# Altium footprint library prtotype1.PcbLib: 29 footprints (part 2 of 2)
Each footprint in its own frame and in the unit in brackets; x right, y up, seen from the top. Pads: shape width x height; smd on the part's side, far side on the other; paste and mask are expansions set on the pad; w line width, h text height; cw(c..) or ccw(c..) is an arc to the next point about the centre after c.
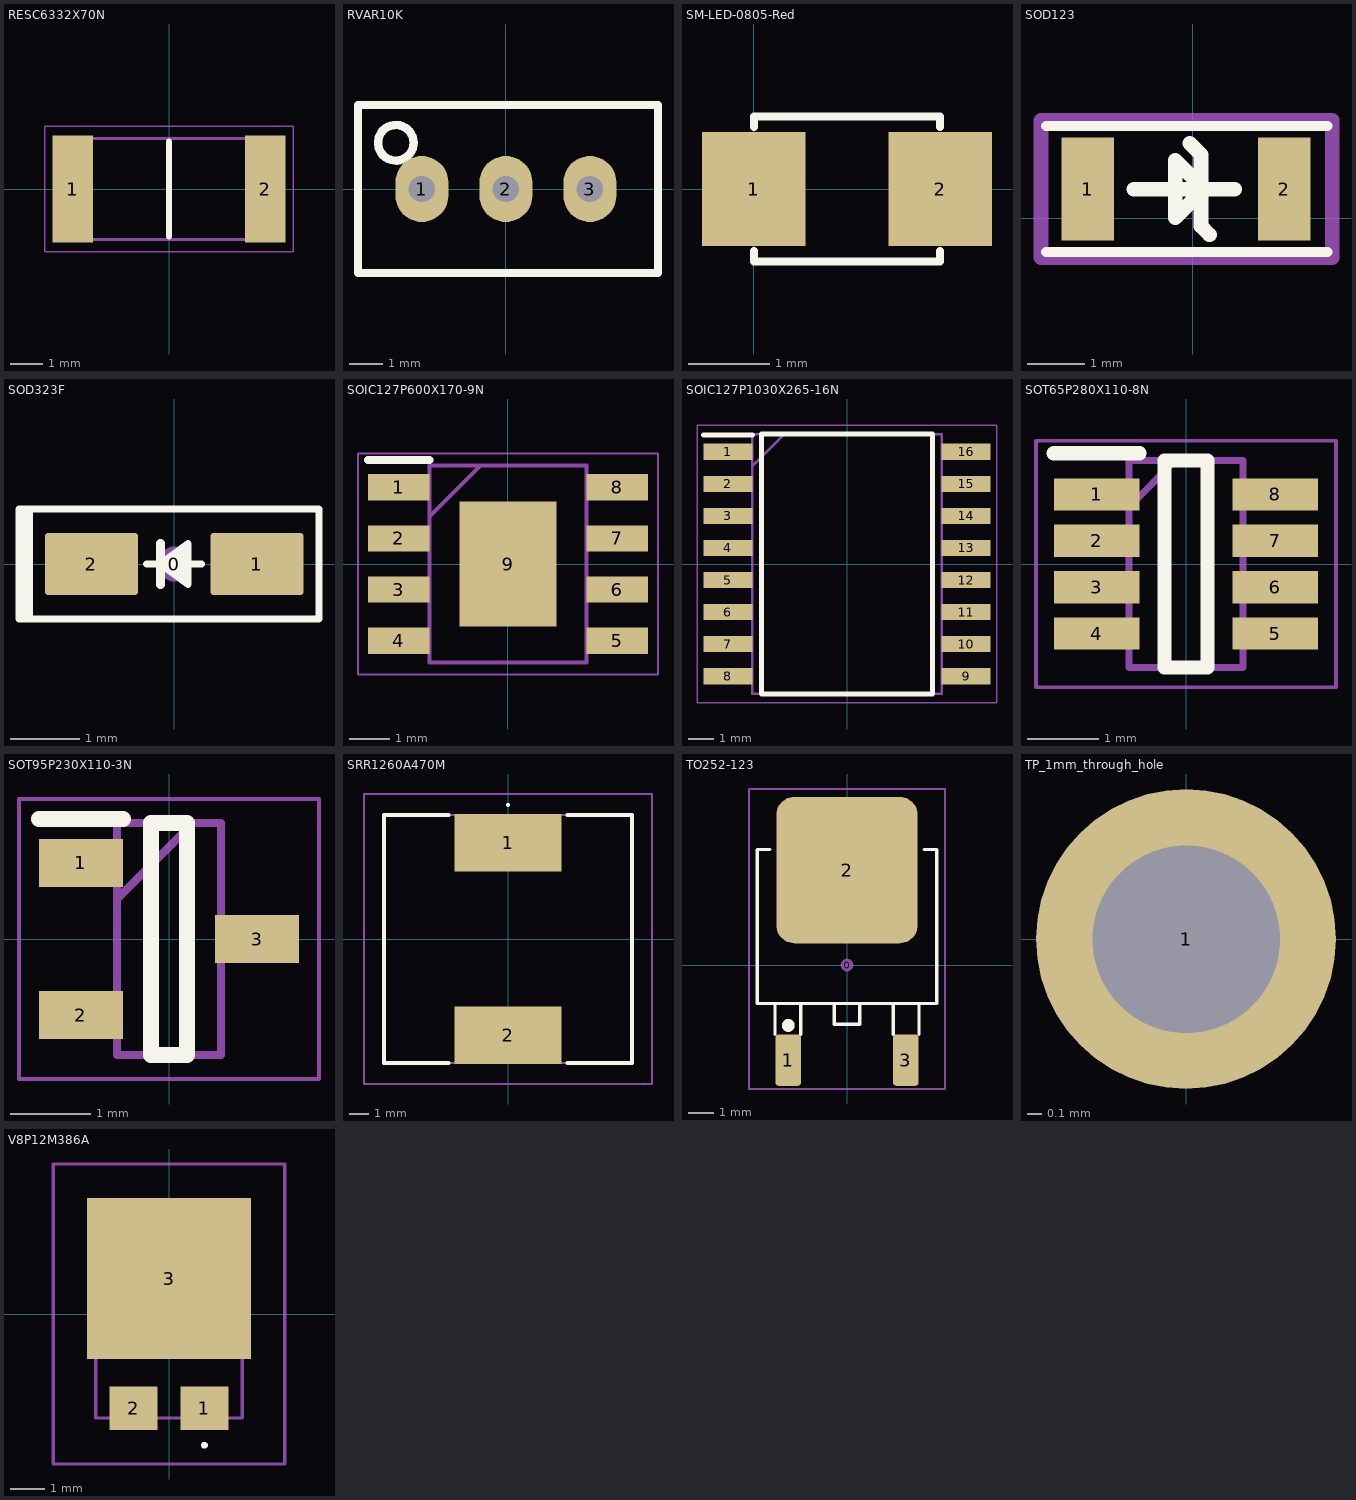
[diagram p1: the footprints below, top view; thin cyan lines are the x and y axes]

## RESC6332X70N [mm]
pads (2):
  rect 1.25x3.35 smd: 1(-3,0) 2(3,0)
Top Overlay:
  lines w0.2: 0,-1.475 0,1.475
Mechanical 13:
  lines w0.1: -3.15,-1.575 -3.15,1.575 3.15,1.575 3.15,-1.575 -3.15,-1.575
Mechanical 15:
  lines w0.05: -3.875,-1.95 -3.875,1.95 3.875,1.95 3.875,-1.95 -3.875,-1.95
3D body "CRCW251215R0JNEG.stp": height 0.7, standoff 0, extent -3.15,-1.575 3.15,1.575

## RVAR10K [mm]
pads (3):
  oval 1.6x2 hole 0.8: 1(-2.54,0) 2(0,0) 3(2.54,0)
Top Overlay:
  circle w0.254: c-3.327,1.397 r0.539
  lines w0.254: -4.47,-2.54 -4.47,2.54 4.597,2.54 4.597,-2.54 -4.47,-2.54
3D body "User Library-Potenciometro Vertical.step": height 12.02, standoff -5.48, extent -4.537,-2.4 4.663,2.4

## SM-LED-0805-Red [mil]
pads (2):
  rect 50x55 smd: 1(0,0) 2(90,0)
Top Overlay:
  lines w4: 0,-30 0,-35 90,-35 90,-30 ; 0,30 0,35 90,35 90,30
3D body "User Library-led_0805-red.step": height 43.31, standoff 0, extent 5.25,-24.6 84.77,24.62

## SOD123 [mm]
pads (2):
  rect 0.915x1.8 smd: 1(-1.829,0.508) 2(1.6,0.508)
Top Overlay:
  lines w0.178: -2.552,-0.592 2.348,-0.592 ; -2.552,1.608 2.348,1.608
  lines w0.254: -1.027,0.503 0.737,0.503 ; -0.052,1.308 0.148,1.108 0.148,0.558 ; 0.148,0.458 -0.302,0.008 -0.302,1.008 0.148,0.558 ; 0.295,-0.289 0.148,-0.142 0.148,0.558
Mechanical 7:
  lines w0.254: -2.642,-0.686 2.438,-0.686 2.438,1.702 -2.642,1.702 -2.642,-0.686
3D body "CDBM.step": height 0.82, standoff 0, extent -2.108,-0.394 1.804,1.41

## SOD323F [mm]
pads (3):
  round 0.508 on Mech14: 0(0,0)
  rrect10% 1.35x0.9 smd mask+0.07: 1(1.2,0) 2(-1.2,0)
Top Overlay:
  region: 0.2,0.3 0.2,-0.3 -0.2,0
  lines w0.1: -2.175,-0.8 -2.175,0.8 ; -2.15,0.8 -2.175,0.8 ; -0.4,0 -0.2,0 ; 0.2,0 0.4,0 ; -2.2,0.8 -2.1,0.8 ; -2.2,0.8 -2.25,0.8 -2.25,-0.8 -2.1,-0.8 ; -2.2,0.8 -2.175,0.8 ; -2.1,-0.8 2.1,-0.8 2.1,0.8 0,0.8 -2.1,0.8 ; -2.1,-0.8 -2.1,0.8 ; -0.2,0 0.2,0.3 0.2,-0.3 -0.2,0
  lines w0.127: -0.2,-0.3 -0.2,0.3
3D body "SOD323F.STEP": height 1, standoff 0, extent -1.25,-0.675 1.25,0.675

## SOIC127P600X170-9N [mm]
pads (9):
  rect 1.525x0.65 smd: 1(-2.712,1.905) 2(-2.712,0.635) 3(-2.712,-0.635) 4(-2.712,-1.905) 5(2.712,-1.905) 6(2.712,-0.635) 7(2.712,0.635) 8(2.712,1.905)
  rect 2.4x3.1 smd: 9(0,0)
Top Overlay:
  lines w0.2: -3.475,2.58 -1.95,2.58
Mechanical 13:
  lines w0.1: -1.95,1.18 -0.68,2.45 ; -1.95,-2.45 -1.95,2.45 1.95,2.45 1.95,-2.45 -1.95,-2.45
Mechanical 15:
  lines w0.05: -3.725,-2.75 -3.725,2.75 3.725,2.75 3.725,-2.75 -3.725,-2.75
3D body "LM5012DDAR.stp": height 1.57, standoff 0, extent -3,-2.45 3,2.45

## SOIC127P1030X265-16N [mm]
pads (16):
  rect 1.95x0.65 smd: 1(-4.725,4.445) 2(-4.725,3.175) 3(-4.725,1.905) 4(-4.725,0.635) 5(-4.725,-0.635) 6(-4.725,-1.905) 7(-4.725,-3.175) 8(-4.725,-4.445) 9(4.725,-4.445) 10(4.725,-3.175) 11(4.725,-1.905) 12(4.725,-0.635) 13(4.725,0.635) 14(4.725,1.905) 15(4.725,3.175) 16(4.725,4.445)
Top Overlay:
  lines w0.2: -5.7,5.12 -3.75,5.12 ; -3.4,-5.15 -3.4,5.15 3.4,5.15 3.4,-5.15 -3.4,-5.15
Mechanical 13:
  lines w0.1: -3.75,3.88 -2.48,5.15 ; -3.75,-5.15 -3.75,5.15 3.75,5.15 3.75,-5.15 -3.75,-5.15
Mechanical 15:
  lines w0.05: -5.95,-5.5 -5.95,5.5 5.95,5.5 5.95,-5.5 -5.95,-5.5
3D body "UCC21542DWR.stp": height 2.59, standoff 0, extent -5.167,-5.15 5.167,5.15

## SOT65P280X110-8N [mm]
pads (8):
  rect 1.2x0.45 smd: 1(-1.25,0.975) 2(-1.25,0.325) 3(-1.25,-0.325) 4(-1.25,-0.975) 5(1.25,-0.975) 6(1.25,-0.325) 7(1.25,0.325) 8(1.25,0.975)
Top Overlay:
  lines w0.2: -1.85,1.55 -0.65,1.55 ; -0.3,-1.45 -0.3,1.45 0.3,1.45 0.3,-1.45 -0.3,-1.45
Mechanical 13:
  lines w0.1: -0.8,0.8 -0.15,1.45 ; -0.8,-1.45 -0.8,1.45 0.8,1.45 0.8,-1.45 -0.8,-1.45
Mechanical 15:
  lines w0.05: -2.1,-1.725 -2.1,1.725 2.1,1.725 2.1,-1.725 -2.1,-1.725
3D body "TLV7022DDFR.stp": height 0.9, standoff 0, extent -1.41,-1.45 1.41,1.45

## SOT95P230X110-3N [mm]
pads (3):
  rect 1.05x0.6 smd: 1(-1.1,0.95) 2(-1.1,-0.95) 3(1.1,0)
Top Overlay:
  lines w0.2: -1.625,1.5 -0.575,1.5 ; -0.225,-1.45 -0.225,1.45 0.225,1.45 0.225,-1.45 -0.225,-1.45
Mechanical 13:
  lines w0.1: -0.65,0.5 0.3,1.45 ; -0.65,-1.45 -0.65,1.45 0.65,1.45 0.65,-1.45 -0.65,-1.45
Mechanical 15:
  lines w0.05: -1.875,-1.75 -1.875,1.75 1.875,1.75 1.875,-1.75 -1.875,-1.75
3D body "TL431MFDT,215.stp": height 0.95, standoff 0, extent -1.201,-1.448 1.199,1.452

## SRR1260A470M [mm]
pads (2):
  rect 5.4x2.9 smd: 1(0,4.85) 2(0,-4.85)
Top Overlay:
  lines w0.1: 0,6.7 ccw(c0,6.75) 0,6.8 ccw(c0,6.75) 0,6.7
  lines w0.2: -3,-6.25 -6.25,-6.25 -6.25,6.25 -3,6.25 ; 3,-6.25 6.25,-6.25 6.25,6.25 3,6.25
Mechanical 13:
  lines w0.1: -6.25,-6.25 -6.25,6.25 6.25,6.25 6.25,-6.25 -6.25,-6.25
Mechanical 15:
  lines w0.1: -7.25,-7.3 -7.25,7.3 7.25,7.3 7.25,-7.3 -7.25,-7.3
3D body "SRR1260A-470M.stp": height 6.25, standoff 0, extent -6.25,-6.25 6.25,6.25

## TO252-123 [mm]
pads (4):
  round 0.5 on Mech15: 0(0,0)
  rrect25% 1x2 smd mask+0.07: 1(-2.285,-3.7) 3(2.285,-3.7)
  rrect25% 5.5x5.7 smd mask+0.07: 2(0,3.7)
Top Overlay:
  circle w0.25: c-2.285,-2.35 r0.125
  lines w0.127: -3,4.5 -3.5,4.5 -3.5,-1.5 3.5,-1.5 3.5,4.5 3,4.5 ; -2.8,-2.7 -2.8,-1.5 -1.8,-1.5 -1.8,-2.7 ; 1.8,-2.7 1.8,-1.5 2.8,-1.5 2.8,-2.7 ; -0.5,-2.3 0.5,-2.3 0.5,-1.5 -0.5,-1.5 -0.5,-2.3
Mechanical 15:
  lines w0.076: -3.81,-4.826 3.81,-4.826 3.81,6.858 -3.81,6.858 -3.81,-4.826
3D body "DPAK.stp": height 2.31, standoff 0, extent -3.3,-3.951 3.3,5.762

## TP_1mm_through_hole [mil]
pads (1):
  round 80 hole 50: 1(0,0)
3D body "testpin red 1mm.stp": height 196.85, standoff -99.6, extent -45.29,-45.29 45.28,45.3

## V8P12M386A [mm]
pads (3):
  rect 1.4x1.27 smd: 1(1.04,-2.765) 2(-1.04,-2.765)
  rect 4.8x4.72 smd: 3(0,1.04)
Top Overlay:
  lines w0.1: 1.04,-3.9 ccw(c1.04,-3.85) 1.04,-3.8 ccw(c1.04,-3.85) 1.04,-3.9
Mechanical 13:
  lines w0.1: -2.15,-3.05 2.15,-3.05 2.15,3.05 -2.15,3.05 -2.15,-3.05
Mechanical 15:
  lines w0.1: -3.4,-4.4 3.4,-4.4 3.4,4.4 -3.4,4.4 -3.4,-4.4
3D body "V8P12-M3_86A.stp": height 1.3, standoff 0, extent -2.15,-3.273 2.15,3.05